# Altium footprint library Connector.PcbLib: 174 footprints (part 11 of 11)
Each footprint in its own frame and in the unit in brackets; x right, y up, seen from the top. Pads: shape width x height; smd on the part's side, far side on the other; paste and mask are expansions set on the pad; w line width, h text height; cw(c..) or ccw(c..) is an arc to the next point about the centre after c.
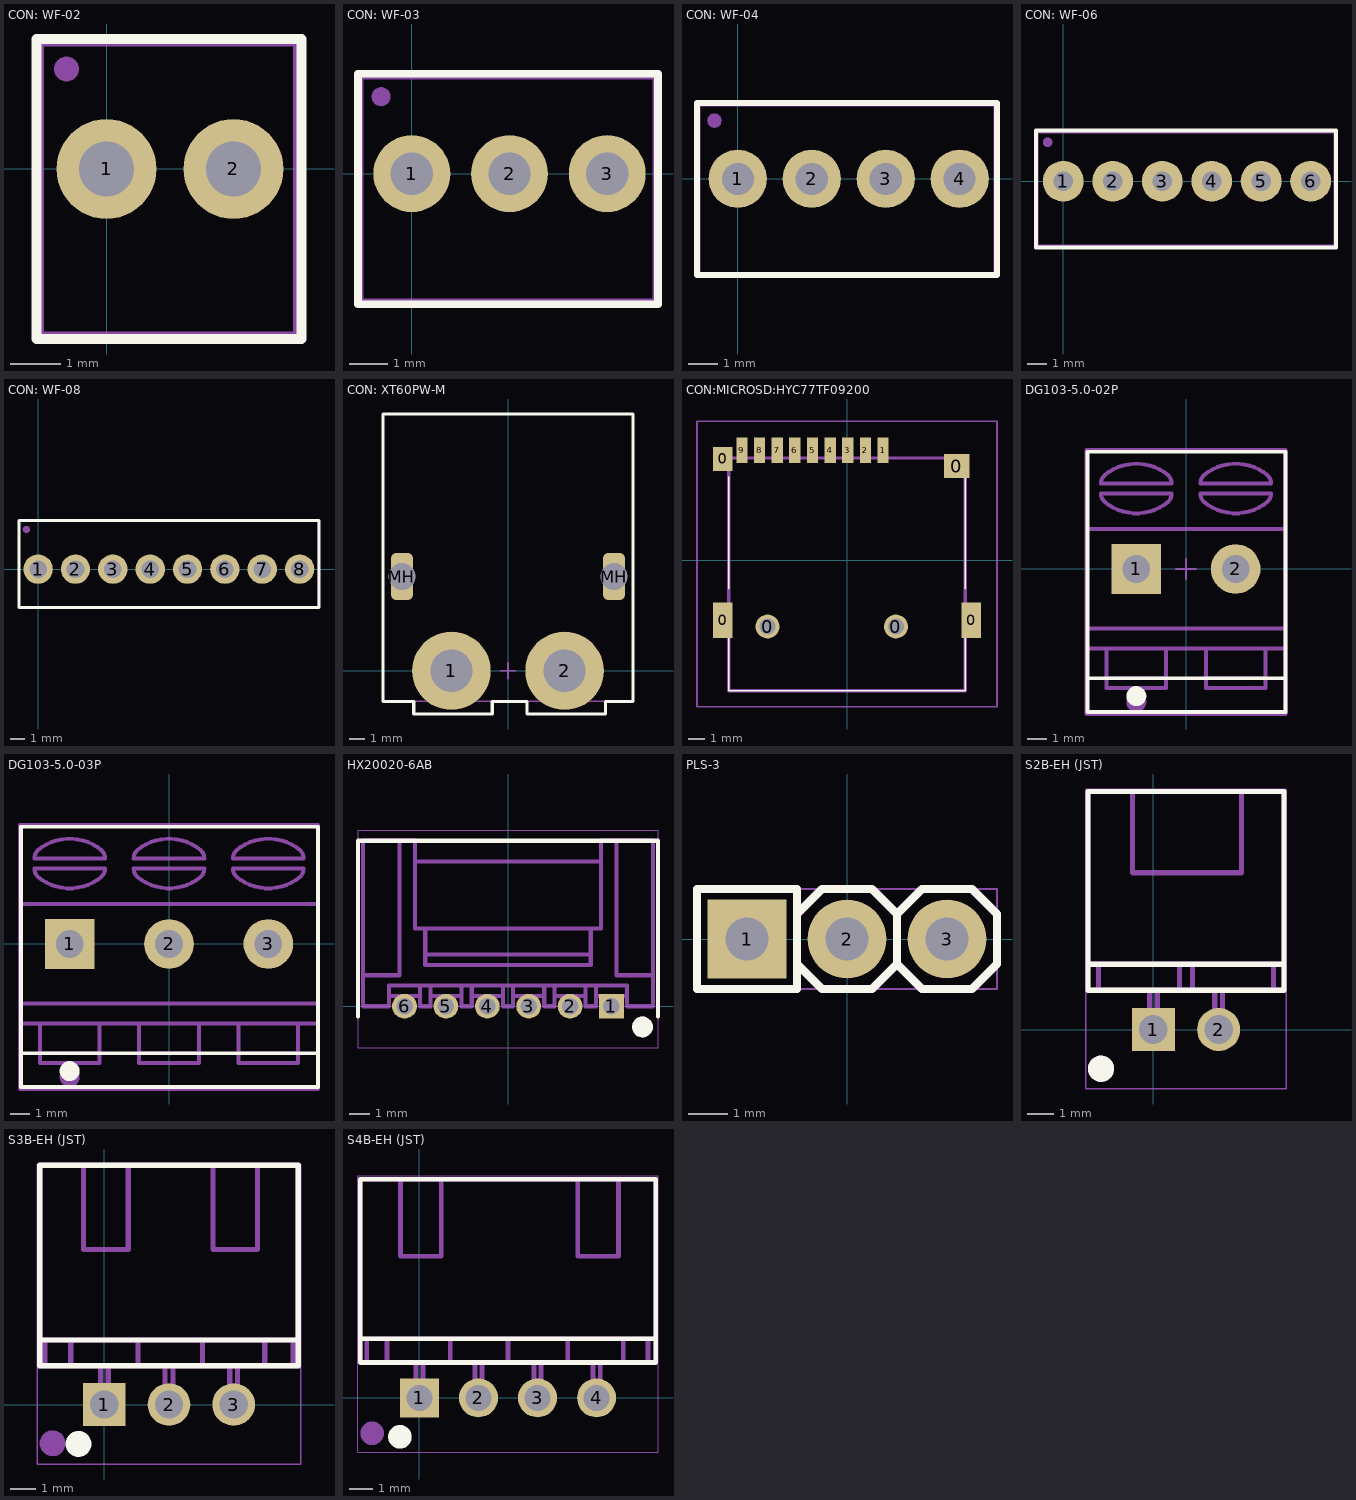
[diagram p10: the footprints below, top view; thin cyan lines are the x and y axes]

## CON: WF-02 [mm]
pads (3):
  round 2 hole 1.1: 1(0,0) 2(2.54,0)
  round 0.5 on Mech1: ""(-0.8,2)
Top Overlay:
  lines w0.2: -1.4,-3.4 -1.4,2.6 3.9,2.6 3.9,-3.4 -1.4,-3.4
Top Assy:
  lines w0.1: -1.3,-3.3 3.78,-3.3 3.78,2.5 -1.3,2.5 -1.3,-3.3
3D body "User Library-WF-02.STEP": height 11.5, standoff -3.3, extent -1.3,-3.3 3.78,2.5

## CON: WF-03 [mm]
pads (4):
  round 2 hole 1.1: 1(0,0) 2(2.54,0) 3(5.08,0)
  round 0.5 on Mech1: ""(-0.8,2)
Top Overlay:
  lines w0.2: -1.4,-3.4 -1.4,2.6 6.4,2.6 6.4,-3.4 -1.4,-3.4
Top Assy:
  lines w0.1: -1.31,-3.3 -1.31,2.5 6.31,2.5 6.31,-3.3 -1.31,-3.3
3D body "User Library-WF-03.STEP": height 11.5, standoff -3.3, extent -1.31,-3.3 6.31,2.5

## CON: WF-04 [mm]
pads (5):
  round 2 hole 1.1: 1(0,0) 2(2.54,0) 3(5.08,0) 4(7.62,0)
  round 0.5 on Mech1: ""(-0.8,2)
Top Overlay:
  lines w0.2: -1.4,-3.3 -1.4,2.6 8.9,2.6 8.9,-3.3 -1.4,-3.3
Top Assy:
  lines w0.1: -1.33,-3.273 -1.33,2.527 8.83,2.527 8.83,-3.273 -1.33,-3.273
3D body "User Library-WF-04.STEP": height 11.66, standoff -3.14, extent -1.33,-3.273 8.83,2.527

## CON: WF-06 [mm]
pads (7):
  round 2.1 hole 1: 1(0,0) 2(2.54,0) 3(5.08,0) 4(7.62,0) 5(10.16,0) 6(12.7,0)
  round 0.5 on Mech1: ""(-0.8,2)
Top Overlay:
  lines w0.2: -1.4,-3.4 14,-3.4 14,2.6 -1.4,2.6 -1.4,-3.4
Top Assy:
  lines w0.1: -1.32,-3.3 13.92,-3.3 13.92,2.5 -1.32,2.5 -1.32,-3.3
3D body "User Library-WF-06.STEP": height 11.5, standoff -3.3, extent -1.32,-3.3 13.92,2.5

## CON: WF-08 [mm]
pads (9):
  round 2 hole 1.2: 1(0,0) 2(2.54,0) 3(5.08,0) 4(7.62,0) 5(10.16,0) 6(12.7,0) 7(15.24,0) 8(17.78,0)
  round 0.5 on Mech1: ""(-0.8,2.7)
Top Overlay:
  lines w0.2: -1.3,-2.6 19.1,-2.6 19.1,3.3 -1.3,3.3 -1.3,-2.6
Top Assy:
  lines w0.1: -1.27,-2.54 -1.27,3.26 19.05,3.26 19.05,-2.54 -1.27,-2.54
3D body "User Library-WF-8.STEP": height 11.4, standoff -3.4, extent -1.27,-2.54 19.05,3.26

## CON: XT60PW-M [mm]
pads (4):
  round 5 hole 2.7: 1(-3.6,0) 2(3.6,0)
  rrect50% 1.4x3 hole 1.7 square: MH(-6.75,6) MH(6.75,6)
Top Overlay:
  lines w0.2: -7.95,-1.95 -7.95,16.35 7.95,16.35 7.95,-1.95 6.2,-1.95 6.2,-2.75 1.2,-2.75 1.2,-1.95 -1,-1.95 -1,-2.75 -6,-2.75 -6,-1.95 -7.95,-1.95
Top Assy:
  lines w0.1: -7.95,-1.95 -7.95,16.35 7.95,16.35 7.95,-1.95 -7.95,-1.95
Area:
  lines w0.1: -0.5,0 0.5,0 ; 0,-0.5 0,0.5 ; -7.95,-1.95 -6,-1.95 -6,-2.75 -1,-2.75 -1,-1.95 1.2,-1.95 1.2,-2.75 6.2,-2.75 6.2,-1.95 7.95,-1.95 7.95,16.35 -7.95,16.35 -7.95,-1.95
3D body "XT60PW.SLDPRT": height 8.5, standoff -2, extent -7.95,-1.95 7.95,16.35

## CON:MICROSD:HYC77TF09200 [mm]
pads (15):
  rect 1.2x2.2 smd: 0(-7.75,-3.725) 0(7.75,-3.725)
  rect 1.2x1.5 smd: 0(-7.75,6.325)
  round 1.5 hole 1: 0(-4.95,-4.125) 0(3.05,-4.125)
  rect 1.6x1.5 smd: 0(6.85,5.875)
  rect 0.7x1.6 smd: 1(2.25,6.875) 2(1.15,6.875) 3(0.05,6.875) 4(-1.05,6.875) 5(-2.15,6.875) 6(-3.25,6.875) 7(-4.35,6.875) 8(-5.45,6.875) 9(-6.55,6.875)
Top Overlay:
  lines w0.1: -7.375,-4.775 -7.375,-8.125 7.375,-8.125 7.375,-4.775 ; -7.375,-1.775 -7.375,5.225 ; 7.375,-1.775 7.375,5.225
3D view:
  lines w0.2: -7.375,-8.125 7.375,-8.125 7.375,6.375 -7.375,6.375 -7.375,-8.125
Area:
  lines w0.1: -9.35,-9.125 9.35,-9.125 9.35,8.675 -9.35,8.675 -9.35,-9.125
3D body "HYC77-TF09-200.stp": height 2.1, standoff -5, extent -8.23,-8.125 8.23,7.605

## DG103-5.0-02P [mm] "Angled PCB Header, pitch 5.0mm, 02p"
height 15.5
pads (2):
  rect 2.5x2.5 hole 1.4: 1(-2.5,0)
  round 2.5 hole 1.4: 2(2.5,0)
Top Overlay:
  circle w0.5: c-2.5,-6.4 r0.25
  lines w0.2: -4.9,-5.5 4.9,-5.5 ; -4.95,-7.2 -4.95,5.9 5,5.9 5,-7.2 -4.95,-7.2
Top Assy:
  circle w0.5: c-2.5,-6.7 r0.25
  lines w0.2: -5,-4 5,-4 ; -5,-3 5,-3 ; -5,2 5,2 ; -4.11,3.39 cw(c-3.7,3.8) -4.28,3.8 -0.72,3.8 cw(c-1.3,3.8) -0.89,3.39 ; -4.11,4.71 ccw(c-3.7,4.3) -4.28,4.3 -0.72,4.3 ccw(c-1.3,4.3) -0.89,4.71 ; -4.107,3.385 ccw(c-2.5,5.3) -0.893,3.385 ; -4.107,4.715 cw(c-2.5,2.8) -0.893,4.715 ; -4,-5.5 -1,-5.5 ; -4,-4 -4,-6 -1,-6 -1,-4 ; 0.89,3.39 cw(c1.3,3.8) 0.72,3.8 4.28,3.8 cw(c3.7,3.8) 4.11,3.39 ; 0.89,4.71 ccw(c1.3,4.3) 0.72,4.3 4.28,4.3 ccw(c3.7,4.3) 4.11,4.71 ; 0.893,3.385 ccw(c2.5,5.3) 4.107,3.385 ; 0.893,4.715 cw(c2.5,2.8) 4.107,4.715 ; 1,-5.5 4,-5.5 ; 1,-4 1,-6 4,-6 4,-4 ; -5,-7.3 5,-7.3 5,6 -5,6 -5,-7.3
  text "'.Designator'" at -2.15,-2.45 h1
Area:
  lines w0.1: -0.5,0 0.5,0 ; 0,-0.5 0,0.5 ; -5,-7.3 5,-7.3 5,6 -5,6 -5,-7.3
3D body "DG103-5.0-02P-14-00AH.STEP": height 15.5, standoff -3.8, extent -5,-7.3 5.6,6

## DG103-5.0-03P [mm] "Angled PCB Header, pitch 5.0mm, 03p"
height 15.5
pads (3):
  rect 2.5x2.5 hole 1.4: 1(-5,0)
  round 2.5 hole 1.4: 2(0,0) 3(5,0)
Top Overlay:
  circle w0.5: c-5,-6.4 r0.25
  lines w0.2: -7.45,5.889 -7.45,-7.2 7.5,-7.2 7.5,5.889 ; -7.45,5.9 7.5,5.9 ; -7.4,-5.5 7.5,-5.5
Top Assy:
  circle w0.5: c-5,-6.7 r0.25
  lines w0.2: -7.5,-4 7.5,-4 ; -7.5,-3 7.5,-3 ; -7.5,2 7.5,2 ; -6.61,3.39 cw(c-6.2,3.8) -6.78,3.8 -3.22,3.8 cw(c-3.8,3.8) -3.39,3.39 ; -6.61,4.71 ccw(c-6.2,4.3) -6.78,4.3 -3.22,4.3 ccw(c-3.8,4.3) -3.39,4.71 ; -6.607,3.385 ccw(c-5,5.3) -3.393,3.385 ; -6.607,4.715 cw(c-5,2.8) -3.393,4.715 ; -6.5,-5.5 -3.5,-5.5 ; -6.5,-4 -6.5,-6 -3.5,-6 -3.5,-4 ; -1.61,3.39 cw(c-1.2,3.8) -1.78,3.8 1.78,3.8 cw(c1.2,3.8) 1.61,3.39 ; -1.61,4.71 ccw(c-1.2,4.3) -1.78,4.3 1.78,4.3 ccw(c1.2,4.3) 1.61,4.71 ; -1.607,3.385 ccw(c0,5.3) 1.607,3.385 ; -1.607,4.715 cw(c0,2.8) 1.607,4.715 ; -1.5,-5.5 1.5,-5.5 ; -1.5,-4 -1.5,-6 1.5,-6 1.5,-4 ; 3.39,3.39 cw(c3.8,3.8) 3.22,3.8 6.78,3.8 cw(c6.2,3.8) 6.61,3.39 ; 3.39,4.71 ccw(c3.8,4.3) 3.22,4.3 6.78,4.3 ccw(c6.2,4.3) 6.61,4.71 ; 3.393,3.385 ccw(c5,5.3) 6.607,3.385 ; 3.393,4.715 cw(c5,2.8) 6.607,4.715 ; 3.5,-5.5 6.5,-5.5 ; 3.5,-4 3.5,-6 6.5,-6 6.5,-4 ; -7.5,-7.3 7.5,-7.3 7.5,6 -7.5,6 -7.5,-7.3
  text "'.Designator'" at -1.3,-2.6 h1
Area:
  lines w0.1: -0.5,0 0.5,0 ; 0,-0.5 0,0.5 ; -7.5,-7.3 7.5,-7.3 7.5,6 -7.5,6 -7.5,-7.3
3D body "DG103-5.0-03P-14-00AH.STEP": height 15.5, standoff -3.8, extent -7.5,-7.3 8.1,6

## HX20020-6AB [mm] "CHINA 6 pins 2 mm pitch thruhole"
pads (6):
  rect 1.2x1.2 hole 0.8: 1(5,0)
  round 1.2 hole 0.8: 2(3,0) 3(1,0) 4(-1,0) 5(-3,0) 6(-5,0)
Top Overlay:
  circle w0.5: c6.5,-1 r0.25
  lines w0.2: -7.25,-0.5 -7.25,8 7.25,8 7.25,-0.5
Top Assy:
  circle w0.5: c6.5,-1 r0.25
  lines w0.2: -7,1.5 -5.25,1.5 -5.25,8 ; -5.75,0.5 -4.25,0.5 ; -5.25,0.5 -5.25,0 -4.75,0 -4.75,0.5 ; -4.5,7 4.5,7 ; -4.25,1 -4.25,0 -3.75,0 -3.75,1 ; -4,2.5 4,2.5 ; -4,3.75 -4,2 4,2 4,3.75 ; -3.75,0.5 -2.25,0.5 ; -3.25,0.5 -3.25,0 -2.75,0 -2.75,0.5 ; -2.25,1 -2.25,0 -1.75,0 -1.75,1 ; -1.75,0.5 -0.25,0.5 ; -1.25,0.5 -1.25,0 -0.75,0 -0.75,0.5 ; -0.25,1 -0.25,0 0.25,0 0.25,1 ; 0.25,0.5 1.75,0.5 ; 0.75,0.5 0.75,0 1.25,0 1.25,0.5 ; 1.75,1 1.75,0 2.25,0 2.25,1 ; 2.25,0.5 3.75,0.5 ; 2.75,0.5 2.75,0 3.25,0 3.25,0.5 ; 3.75,1 3.75,0 4.25,0 4.25,1 ; 4.25,0.5 5.75,0.5 ; 4.75,0.5 4.75,0 5.25,0 5.25,0.5 ; 7,1.5 5.25,1.5 5.25,8 ; -5.25,8 -7,8 -7,0 -5.75,0 -5.75,1 5.75,1 5.75,0 7,0 7,8 5.25,8 ; -5.25,8 -4.5,8 -4.5,3.75 4.5,3.75 4.5,8 5.25,8
  text "'.Designator'" at -0.75,4.75 h1
Area:
  lines w0.05: -7.25,-2 -7.25,8.5 7.25,8.5 7.25,-2 -7.25,-2
3D body "Molex 35363-0660.step": height 5.29, standoff -3.41, extent -7.15,-1.95 7.15,8.55

## PLS-3 [mm] "1 row; pitch 2.54 mm"
height 10
pads (3):
  rect 2x2 hole 1.1: 1(-2.54,0)
  round 2 hole 1.1: 2(0,0) 3(2.54,0)
Top Overlay:
  lines w0.2: -1.27,-0.635 -0.635,-1.27 0.635,-1.27 1.27,-0.635 ; -1.27,0.635 -0.635,1.27 0.635,1.27 1.27,0.635 ; 1.27,-0.635 1.905,-1.27 3.175,-1.27 3.81,-0.635 3.81,0.635 3.175,1.27 1.905,1.27 1.27,0.635 ; 1.27,-0.635 1.27,0.635 ; -3.81,-1.27 -1.27,-1.27 -1.27,1.27 -3.81,1.27 -3.81,-1.27
Top Assy:
  lines w0.2: -1.27,-0.635 -0.635,-1.27 0.635,-1.27 1.27,-0.635 ; -1.27,0.635 -0.635,1.27 0.635,1.27 1.27,0.635 ; 1.27,-0.635 1.27,0.635 ; 1.27,-0.635 1.905,-1.27 3.175,-1.27 3.81,-0.635 3.81,0.635 3.175,1.27 1.905,1.27 1.27,0.635 ; -3.81,-1.27 -3.81,1.27 -1.27,1.27 -1.27,-1.27 -3.81,-1.27
Area:
  lines w0.05: -3.81,-1.27 -3.81,1.27 3.81,1.27 3.81,-1.27 -3.81,-1.27
  lines w0.1: -0.5,0 0.5,0 ; 0,-0.5 0,0.5
3D body "PLS-3.STEP": height 8.54, standoff -3, extent -3.81,-1.27 3.81,1.27

## S2B-EH (JST) [mm]
pads (2):
  rect 1.65x1.65 hole 1.1: 1(0,0)
  round 1.65 hole 1.1: 2(2.5,0)
Top Overlay:
  circle w0.5: c-2,-1.5 r0.25
  lines w0.2: -2.5,2.5 5,2.5 ; -2.5,1.5 5,1.5 5,9.1 -2.5,9.1 -2.5,1.5
Top Assy:
  circle w0.5: c-2,-1.5 r0.25
  lines w0.2: -2.5,2.5 5,2.5 ; -2.1,1.5 -2.1,2.5 ; -0.8,9 -0.8,6 3.375,6 3.375,9 ; -0.15,1.4 -0.15,0 0.15,0 0.15,1.4 ; 1,1.5 1,2.5 ; 1.5,1.5 1.5,2.5 ; 2.35,1.4 2.35,0 2.65,0 2.65,1.4 ; 4.6,1.5 4.6,2.5 ; -2.5,1.5 -2.5,9.1 5,9.1 5,1.5 -2.5,1.5
  text "'.Designator'" at -1.1,4.8 h1
Area:
  lines w0.05: -2.575,-2.275 -2.575,9.2 5.075,9.2 5.075,-2.275 -2.575,-2.275
3D body "S2B-XH.STEP": height 6.1, standoff -3.4, extent -2.45,-2.3 4.95,9.2

## S3B-EH (JST) [mm]
pads (3):
  rect 1.65x1.65 hole 1.1: 1(0,0)
  round 1.65 hole 1.1: 2(2.5,0) 3(5,0)
Top Overlay:
  circle w0.5: c-1,-1.525 r0.25
  lines w0.2: -2.5,2.5 7.5,2.5 ; -2.5,1.5 7.5,1.5 7.5,9.25 -2.5,9.25 -2.5,1.5
Top Assy:
  circle w0.5: c-2,-1.5 r0.25
  lines w0.2: -2.5,2.5 7.5,2.5 ; -2.3,1.5 -2.3,2.5 ; -1.3,1.5 -1.3,2.5 ; -0.8,9.2 -0.8,6 0.925,6 0.925,9.2 ; -0.15,1.4 -0.15,0 0.15,0 0.15,1.4 ; 1.3,1.5 1.3,2.5 ; 2.35,1.4 2.35,0 2.65,0 2.65,1.4 ; 3.8,1.5 3.8,2.5 ; 4.2,9.2 4.2,6 5.925,6 5.925,9.2 ; 4.85,1.4 4.85,0 5.15,0 5.15,1.4 ; 6.2,1.5 6.2,2.5 ; 7.3,1.5 7.3,2.5 ; -2.5,1.5 7.5,1.5 7.5,9.25 -2.5,9.25 -2.5,1.5
  text "'.Designator'" at 0.1,4.7 h1
Area:
  lines w0.05: -2.6,-2.3 -2.6,9.3 7.6,9.3 7.6,-2.3 -2.6,-2.3
3D body "S3B-XH.STEP": height 6.1, standoff -3.4, extent -2.425,-2.25 7.475,9.25

## S4B-EH (JST) [mm]
pads (4):
  rect 1.65x1.65 hole 1.1: 1(0,0)
  round 1.65 hole 1.1: 2(2.5,0) 3(5,0) 4(7.5,0)
Top Overlay:
  circle w0.5: c-0.825,-1.65 r0.25
  lines w0.2: -2.5,2.5 10,2.5 ; -2.5,1.5 -2.5,9.25 10,9.25 10,1.5 -2.5,1.5
Top Assy:
  circle w0.5: c-2,-1.5 r0.25
  lines w0.2: -2.5,2.5 10,2.5 ; -2.225,1.525 -2.225,2.475 ; -1.375,1.525 -1.375,2.475 ; -0.8,9.2 -0.8,6 0.925,6 0.925,9.2 ; -0.15,1.5 -0.15,0 0.15,0 0.15,1.5 ; 1.3,1.5 1.3,2.5 ; 2.35,1.5 2.35,0 2.65,0 2.65,1.5 ; 3.75,1.5 3.75,2.5 ; 4.85,1.5 4.85,0 5.15,0 5.15,1.5 ; 6.275,1.5 6.275,2.5 ; 6.7,9.2 6.7,6 8.425,6 8.425,9.2 ; 7.35,1.5 7.35,0 7.65,0 7.65,1.5 ; 8.625,1.5 8.625,2.5 ; 9.675,1.575 9.675,2.5 ; -2.5,1.5 10,1.5 10,9.25 -2.5,9.25 -2.5,1.5
  text "'.Designator'" at 1.1,4.6 h1
Area:
  lines w0.05: -2.6,-2.3 10.1,-2.3 10.1,9.4 -2.6,9.4 -2.6,-2.3
3D body "S4B-XH.STEP": height 6.1, standoff -3.4, extent -2.45,-2.3 9.95,9.2